# Altium footprint library General.PcbLib: 446 footprints (part 28 of 28)
Each footprint in its own frame and in the unit in brackets; x right, y up, seen from the top. Pads: shape width x height; smd on the part's side, far side on the other; paste and mask are expansions set on the pad; w line width, h text height; cw(c..) or ccw(c..) is an arc to the next point about the centre after c.
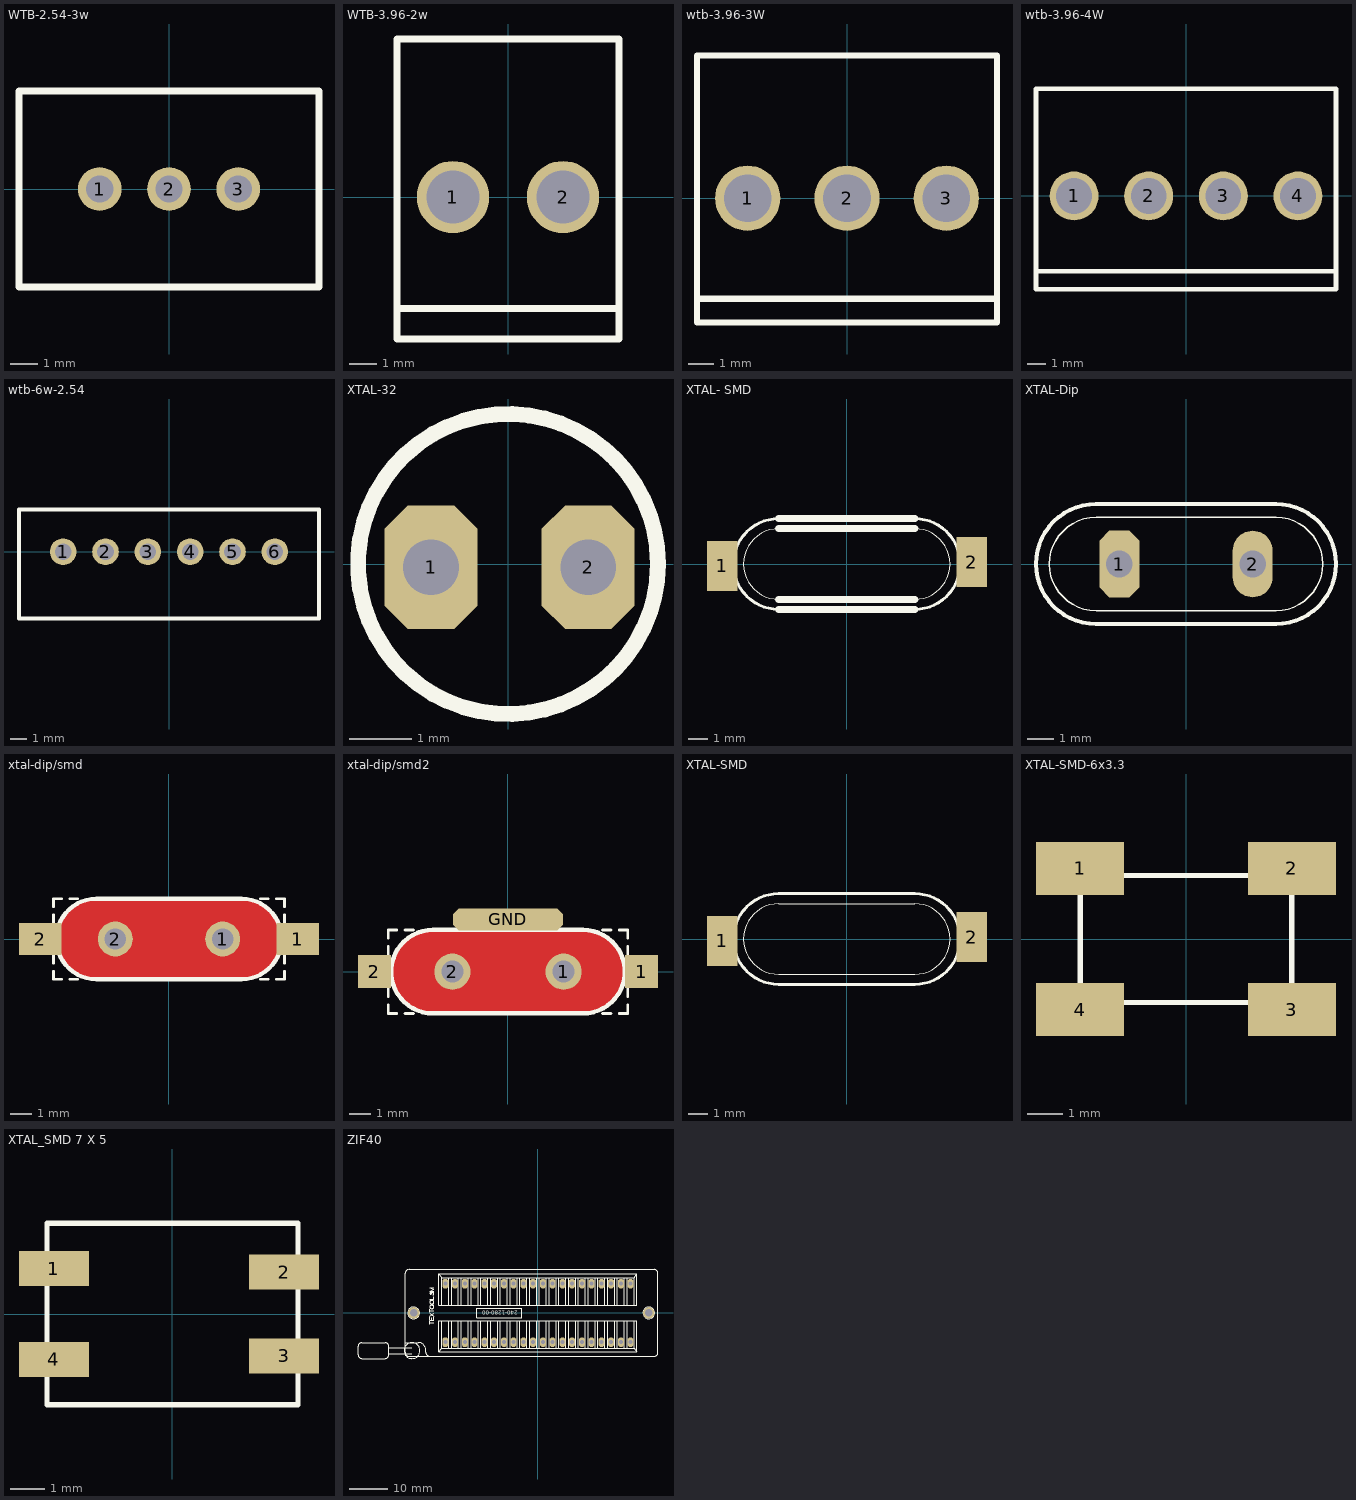
[diagram p27: the footprints below, top view; thin cyan lines are the x and y axes]

## WTB-2.54-3w [mm]
pads (3):
  round 1.6 hole 1: 1(-2.54,0) 2(0,0) 3(2.54,0)
Top Overlay:
  lines w0.254: -5.5,-3.6 5.5,-3.6 5.5,3.6 -5.5,3.6 -5.5,-3.6
3D body "wtb-2.54-3w.stp": height 10.95, standoff -2.85, extent -5.459,-3.605 5.511,3.605

## WTB-3.96-2w [mm]
pads (2):
  round 2.6 hole 1.9: 1(-1.98,0) 2(1.98,0)
Top Overlay:
  lines w0.254: -4,-4 4,-4 ; -4,-5.105 -4,5.69 4,5.69 4,-5.105 -4,-5.105
3D body "wtb3.96S.stp": height 14.25, standoff -3.2, extent -4.065,-5.092 3.965,5.658

## wtb-3.96-3W [mm]
pads (3):
  round 2.6 hole 1.9: 1(-3.96,0) 2(0,0) 3(3.96,0)
Top Overlay:
  lines w0.254: -5.98,-4 5.969,-4 ; -5.98,-4.953 5.98,-4.953 5.98,5.69 -5.98,5.69 -5.98,-4.953
3D body "wtb3.96S.stp": height 14.25, standoff -3.2, extent -2.085,-5.092 5.945,5.658
3D body "wtb3.96S.stp": height 14.25, standoff -3.2, extent -6.045,-5.092 1.985,5.658

## wtb-3.96-4W [mm] "wire to borad\"
pads (4):
  round 2.6 hole 1.9: 1(-5.94,0) 2(-1.98,0) 3(1.98,0) 4(5.94,0)
Top Overlay:
  lines w0.254: -7.96,-4 7.925,-4 ; 7.95,-4.953 -7.96,-4.953 -7.96,5.69 7.96,5.69 7.96,-4.953
3D body "wtb3.96S.stp": height 14.25, standoff -3.2, extent -0.105,-5.092 7.925,5.658
3D body "wtb3.96S.stp": height 14.25, standoff -3.2, extent -8.025,-5.092 0.005,5.658

## wtb-6w-2.54 [mm]
pads (6):
  round 1.6 hole 1: 1(-6.35,0) 2(-3.81,0) 3(-1.27,0) 4(1.27,0) 5(3.81,0) 6(6.35,0)
Top Overlay:
  lines w0.254: -9,-4.013 9,-4.013 9,2.54 -9,2.54 -9,-4.013
3D body "HDR-6x1-box.stp": height 11.71, standoff -3.4, extent -8.89,-4.064 8.89,2.54

## XTAL-32 [mm] "crystall clock 32.768 mhz"
pads (2):
  oct 1.5x2 hole 0.9: 1(-1.245,-0.051) 2(1.295,-0.051)
Top Overlay:
  circle w0.254: c0,0 r2.426
3D body "rtc crystall.step": height 1.95, standoff -9.2, extent -1.651,-1.651 1.449,1.449

## XTAL- SMD [mm]
pads (2):
  rect 1.524x2.54 smd: 1(-6.275,-0.1) 2(6.3,0.1)
Top Overlay:
  lines w0.051: -3.429,-1.778 cw(c-3.429,0) -3.429,1.778 ; 3.429,-1.778 ccw(c3.429,0) 3.429,1.778
  lines w0.152: -3.429,-2.286 cw(c-3.429,0) -3.429,2.286 ; 3.429,-2.286 ccw(c3.429,0) 3.429,2.286
  lines w0.349: -3.429,-2.286 3.429,-2.286 ; -3.429,-1.778 3.429,-1.778 ; -3.429,1.778 3.429,1.778 ; -3.429,2.286 3.429,2.286
3D body "User Library-SMU4.STEP": height 3.92, standoff -0.08, extent -6.275,-2.5 6.225,2.3

## XTAL-Dip [mil]
pads (2):
  oct 60x100 hole 40: 1(-100,0)
  oval 60x100 hole 40: 2(100,0)
Top Overlay:
  lines w2: -135,-70 cw(c-135,0) -135,70 135,70 cw(c135,0) 135,-70 -135,-70
  lines w6: -135,-90 cw(c-135,0) -135,90 135,90 cw(c135,0) 135,-90 -135,-90
3D body "crystall.step": height 149.61, standoff -145.67, extent -225,-90 221.85,93.07
3D body: height 118.11, standoff 0, extent -116.37,-15.72 -85,15.72
3D body: height 118.11, standoff 0, extent 85,-15 116.37,16.43

## xtal-dip/smd [mm]
pads (4):
  round 1.651 hole 1: 1(2.54,0) 2(-2.54,0)
  rect 2x1.5 smd: 1(6.096,0) 2(-6.096,0)
Top Layer:
  pour cut-out: 3.429,1.905 3.617,1.905 3.985,1.832 4.331,1.688 4.643,1.48 4.909,1.214 5.117,0.902 5.261,0.556 5.334,0.188 5.334,0 5.334,-0.188 5.261,-0.556 5.117,-0.902 4.909,-1.214 4.643,-1.48 4.331,-1.688 3.985,-1.832 3.617,-1.905 3.429,-1.905 -3.429,-1.905 -3.617,-1.905 -3.985,-1.832 -4.331,-1.688 -4.643,-1.48 -4.909,-1.214 -5.117,-0.902 -5.261,-0.556 -5.334,-0.188 -5.334,0 -5.334,0.188 -5.261,0.556 -5.117,0.902 -4.909,1.214 -4.643,1.48 -4.331,1.688 -3.985,1.832 -3.617,1.905 -3.429,1.905
Top Overlay:
  lines w0.127: -5.461,-1.524 -5.461,-1.905 -5.08,-1.905 ; -5.461,-1.143 -5.461,-0.762 ; -5.461,0.762 -5.461,1.143 ; -5.461,1.524 -5.461,1.905 -5.08,1.905 ; -4.699,-1.905 -4.318,-1.905 ; -4.699,1.905 -4.318,1.905 ; 4.318,-1.905 4.699,-1.905 ; 4.318,1.905 4.699,1.905 ; 5.08,-1.905 5.461,-1.905 5.461,-1.524 ; 5.08,1.905 5.461,1.905 5.461,1.524 ; 5.461,-1.143 5.461,-0.762 ; 5.461,0.762 5.461,1.143
  lines w0.203: -3.429,-1.905 cw(c-3.429,0) -3.429,1.905 3.429,1.905 cw(c3.429,0) 3.429,-1.905 -3.429,-1.905
3D body "Crystal.STEP": height 3.42, standoff 0.02, extent -5.242,-2.235 5.258,2.265

## xtal-dip/smd2 [mm]
pads (5):
  round 1.651 hole 1: 1(2.54,0) 2(-2.54,0)
  rect 1.5x1.5 smd: 1(6.096,0) 2(-6.096,0)
  oct 5x1 smd: GND(0,2.388)
Top Layer:
  pour cut-out: 3.429,1.905 3.617,1.905 3.985,1.832 4.331,1.688 4.643,1.48 4.909,1.214 5.117,0.902 5.261,0.556 5.334,0.188 5.334,0 5.334,-0.188 5.261,-0.556 5.117,-0.902 4.909,-1.214 4.643,-1.48 4.331,-1.688 3.985,-1.832 3.617,-1.905 3.429,-1.905 -3.429,-1.905 -3.617,-1.905 -3.985,-1.832 -4.331,-1.688 -4.643,-1.48 -4.909,-1.214 -5.117,-0.902 -5.261,-0.556 -5.334,-0.188 -5.334,0 -5.334,0.188 -5.261,0.556 -5.117,0.902 -4.909,1.214 -4.643,1.48 -4.331,1.688 -3.985,1.832 -3.617,1.905 -3.429,1.905
Top Overlay:
  lines w0.127: -5.461,-1.524 -5.461,-1.905 -5.08,-1.905 ; -5.461,-1.143 -5.461,-0.762 ; -5.461,0.762 -5.461,1.143 ; -5.461,1.524 -5.461,1.905 -5.08,1.905 ; -4.699,-1.905 -4.318,-1.905 ; -4.699,1.905 -4.318,1.905 ; 4.318,-1.905 4.699,-1.905 ; 4.318,1.905 4.699,1.905 ; 5.08,-1.905 5.461,-1.905 5.461,-1.524 ; 5.08,1.905 5.461,1.905 5.461,1.524 ; 5.461,-1.143 5.461,-0.762 ; 5.461,0.762 5.461,1.143
  lines w0.203: -3.429,-1.905 cw(c-3.429,0) -3.429,1.905 3.429,1.905 cw(c3.429,0) 3.429,-1.905 -3.429,-1.905
3D body "Crystal.STEP": height 3.42, standoff 0.02, extent -5.242,-2.235 5.258,2.265

## XTAL-SMD [mm]
pads (2):
  rect 1.524x2.54 smd: 1(-6.275,-0.1) 2(6.3,0.1)
Top Overlay:
  lines w0.051: -3.429,-1.778 cw(c-3.429,0) -3.429,1.778 3.429,1.778 cw(c3.429,0) 3.429,-1.778 -3.429,-1.778
  lines w0.152: -3.429,-2.286 cw(c-3.429,0) -3.429,2.286 3.429,2.286 cw(c3.429,0) 3.429,-2.286 -3.429,-2.286
3D body "User Library-SMU4.STEP": height 3.92, standoff -0.08, extent -6.275,-2.5 6.225,2.3

## XTAL-SMD-6x3.3 [mm]
pads (4):
  rect 2.5x1.5 smd: 1(-3,2) 2(3,2) 3(3,-2) 4(-3,-2)
Top Overlay:
  lines w0.15: -3,-1.5 -2.7,-1.8 2.8,-1.8 3,-1.6 3,1.5 2.7,1.8 -2.7,1.8 -3,1.5 -3,-1.5
3D body "User Library-ABMM2.STEP": height 1.21, standoff 0, extent -3,-1.8 3,1.8

## XTAL_SMD 7 X 5 [mm]
pads (4):
  rect 2x1 smd: 1(-3.4,1.3) 2(3.2,1.2) 3(3.2,-1.2) 4(-3.4,-1.3)
Top Overlay:
  lines w0.15: -3.6,-2.6 -3.6,2.6 3.6,2.6 3.6,-2.6 -3.6,-2.6
3D body "User Library-ABMM.STEP": height 1.3, standoff 0, extent -3.6,-2.6 3.6,2.6

## ZIF40 [mil]
height 472.44
pads (42):
  oct 60x100 hole 40: 1(-950,-300) 2(-850,-300) 3(-750,-300) 4(-650,-300) 5(-550,-300) 6(-450,-300) 7(-350,-300) 8(-250,-300) 9(-150,-300) 10(-50,-300) 11(50,-300) 12(150,-300) 13(250,-300) 14(350,-300) 15(450,-300) 16(550,-300) 17(650,-300) 18(750,-300) 19(850,-300) 20(950,-300) 21(950,300) 22(850,300) 23(750,300) 24(650,300) 25(550,300) 26(450,300) 27(350,300) 28(250,300) 29(150,300) 30(50,300) 31(-50,300) 32(-150,300) 33(-250,300) 34(-350,300) 35(-450,300) 36(-550,300) 37(-650,300) 38(-750,300) 39(-850,300) 40(-950,300)
  round 118.11 hole 78.74 unplated: ""(-1274.02,0) ""(1136.22,0)
Top Overlay:
  drawing of 197 lines, arcs and shapes, not listed
  text "240-1280-00" at -205,20 h40
3D body "SW3dPS-zif.STEP": height 433.07, standoff -196.85, extent -1842.35,-488.81 1196.68,450.79